# Altium schematic symbol library jlcpcb_2025_04_capacitors_extended_1206.schlib: 2503 symbols (part 5 of 14) (continued)
## C1206X475K025T
designator C?  Capacitance: 4.7uF  (hidden comment: *)
Capacitor, Ceramic (MLCC), 4.7uF, ±10%, 25V, X7R, ±10%, SMD 1206; Manufacturer: IHHEC(HOLY STONE ENTERPRISE CO., LTD); Manufacturer Part Number: C1206X475K025T; Package Size: 1206; JLCPCB Basic Part: No; JLCPCB Part Number: C915816; Supplier 1: LCSC; Category: Capacitors - MLCC; Supplier Part Number 1: C915816; Tolerance: ±10%; Voltage Rating: 25V; Temperature Coefficient: X7R; RoHS: Yes; ComponentLink1Description: Datasheet; ComponentLink1URL: https://wmsc.lcsc.com/wmsc/upload/file/pdf/v2/lcsc/2304140030_IHHEC-HOLY-STONE-ENTERPRISE-CO---LTD-C1206X475K025T_C915816.pdf; ComponentLink2Description: JLCPCB Part URL; ComponentLink2URL: https://jlcpcb.com/partdetail/C915816; ComponentLink3Description: LCSC Part URL; ComponentLink3URL: https://lcsc.com/product-detail/Multilayer-Ceramic-Capacitors-MLCC---SMD-SMT_IHHECHOLY-STONE-ENTERPRISE-CO.%2C-LTD-IHHECHOLY-STONE-ENTERPRISE-CO.%2C-LTD-C1206X475K025T_C915816.html
footprint CAP-1206 (1206 (3216M) Capacitor)
pins: 1, 2

## C1206X475K050T
designator C?  Capacitance: 4.7uF  (hidden comment: *)
Capacitor, Ceramic (MLCC), 4.7uF, ±10%, 50V, X7R, ±10%, SMD 1206; Manufacturer: IHHEC(HOLY STONE ENTERPRISE CO., LTD); Manufacturer Part Number: C1206X475K050T; Package Size: 1206; JLCPCB Basic Part: No; JLCPCB Part Number: C915818; Supplier 1: LCSC; Category: Capacitors - MLCC; Supplier Part Number 1: C915818; Tolerance: ±10%; Voltage Rating: 50V; Temperature Coefficient: X7R; RoHS: Yes; ComponentLink1Description: Datasheet; ComponentLink1URL: https://wmsc.lcsc.com/wmsc/upload/file/pdf/v2/lcsc/2304140030_IHHEC-HOLY-STONE-ENTERPRISE-CO---LTD-C1206X475K050T_C915818.pdf; ComponentLink2Description: JLCPCB Part URL; ComponentLink2URL: https://jlcpcb.com/partdetail/C915818; ComponentLink3Description: LCSC Part URL; ComponentLink3URL: https://lcsc.com/product-detail/Multilayer-Ceramic-Capacitors-MLCC---SMD-SMT_IHHECHOLY-STONE-ENTERPRISE-CO.%2C-LTD-IHHECHOLY-STONE-ENTERPRISE-CO.%2C-LTD-C1206X475K050T_C915818.html
footprint CAP-1206 (1206 (3216M) Capacitor)
pins: 1, 2

## C1206X475M050T
designator C?  Capacitance: 4.7uF  (hidden comment: *)
Capacitor, Ceramic (MLCC), 4.7uF, ±20%, 50V, X7R, ±20%, SMD 1206; Manufacturer: IHHEC(HOLY STONE ENTERPRISE CO., LTD); Manufacturer Part Number: C1206X475M050T; Package Size: 1206; JLCPCB Basic Part: No; JLCPCB Part Number: C961529; Supplier 1: LCSC; Category: Capacitors - MLCC; Supplier Part Number 1: C961529; Tolerance: ±20%; Voltage Rating: 50V; Temperature Coefficient: X7R; RoHS: Yes; ComponentLink1Description: Datasheet; ComponentLink1URL: https://wmsc.lcsc.com/wmsc/upload/file/pdf/v2/lcsc/2304140030_IHHEC-HOLY-STONE-ENTERPRISE-CO---LTD-C1206X475M050T_C961529.pdf; ComponentLink2Description: JLCPCB Part URL; ComponentLink2URL: https://jlcpcb.com/partdetail/C961529; ComponentLink3Description: LCSC Part URL; ComponentLink3URL: https://lcsc.com/product-detail/Multilayer-Ceramic-Capacitors-MLCC---SMD-SMT_IHHECHOLY-STONE-ENTERPRISE-CO.%2C-LTD-IHHECHOLY-STONE-ENTERPRISE-CO.%2C-LTD-C1206X475M050T_C961529.html
footprint CAP-1206 (1206 (3216M) Capacitor)
pins: 1, 2

## C1206X561K102T
designator C?  Capacitance: 560pF  (hidden comment: *)
Capacitor, Ceramic (MLCC), 560pF, ±10%, 1kV, X7R, ±10%, SMD 1206; Manufacturer: IHHEC(HOLY STONE ENTERPRISE CO., LTD); Manufacturer Part Number: C1206X561K102T; Package Size: 1206; JLCPCB Basic Part: No; JLCPCB Part Number: C106085; Supplier 1: LCSC; Category: Capacitors - MLCC; Supplier Part Number 1: C106085; Tolerance: ±10%; Voltage Rating: 1kV; Temperature Coefficient: X7R; RoHS: Yes; ComponentLink1Description: Datasheet; ComponentLink1URL: https://wmsc.lcsc.com/wmsc/upload/file/pdf/v2/lcsc/2304140030_IHHEC-HOLY-STONE-ENTERPRISE-CO---LTD-C1206X561K102T_C106085.pdf; ComponentLink2Description: JLCPCB Part URL; ComponentLink2URL: https://jlcpcb.com/partdetail/C106085; ComponentLink3Description: LCSC Part URL; ComponentLink3URL: https://lcsc.com/product-detail/Multilayer-Ceramic-Capacitors-MLCC---SMD-SMT_IHHECHOLY-STONE-ENTERPRISE-CO.%2C-LTD-IHHECHOLY-STONE-ENTERPRISE-CO.%2C-LTD-C1206X561K102T_C106085.html
footprint CAP-1206 (1206 (3216M) Capacitor)
pins: 1, 2

## C1206X561K202T
designator C?  Capacitance: 560pF  (hidden comment: *)
Capacitor, Ceramic (MLCC), 560pF, ±10%, 2kV, X7R, ±10%, SMD 1206; Manufacturer: IHHEC(HOLY STONE ENTERPRISE CO., LTD); Manufacturer Part Number: C1206X561K202T; Package Size: 1206; JLCPCB Basic Part: No; JLCPCB Part Number: C915829; Supplier 1: LCSC; Category: Capacitors - MLCC; Supplier Part Number 1: C915829; Tolerance: ±10%; Voltage Rating: 2kV; Temperature Coefficient: X7R; RoHS: Yes; ComponentLink1Description: Datasheet; ComponentLink1URL: https://wmsc.lcsc.com/wmsc/upload/file/pdf/v2/lcsc/2304140030_IHHEC-HOLY-STONE-ENTERPRISE-CO---LTD-C1206X561K202T_C915829.pdf; ComponentLink2Description: JLCPCB Part URL; ComponentLink2URL: https://jlcpcb.com/partdetail/C915829; ComponentLink3Description: LCSC Part URL; ComponentLink3URL: https://lcsc.com/product-detail/Multilayer-Ceramic-Capacitors-MLCC---SMD-SMT_IHHECHOLY-STONE-ENTERPRISE-CO.%2C-LTD-IHHECHOLY-STONE-ENTERPRISE-CO.%2C-LTD-C1206X561K202T_C915829.html
footprint CAP-1206 (1206 (3216M) Capacitor)
pins: 1, 2

## C1206X562K102T
designator C?  Capacitance: 5.6nF  (hidden comment: *)
Capacitor, Ceramic (MLCC), 5.6nF, ±10%, 1kV, X7R, ±10%, SMD 1206; Manufacturer: IHHEC(HOLY STONE ENTERPRISE CO., LTD); Manufacturer Part Number: C1206X562K102T; Package Size: 1206; JLCPCB Basic Part: No; JLCPCB Part Number: C480252; Supplier 1: LCSC; Category: Capacitors - MLCC; Supplier Part Number 1: C480252; Tolerance: ±10%; Voltage Rating: 1kV; Temperature Coefficient: X7R; RoHS: Yes; ComponentLink1Description: Datasheet; ComponentLink1URL: https://wmsc.lcsc.com/wmsc/upload/file/pdf/v2/lcsc/2304140030_IHHEC-HOLY-STONE-ENTERPRISE-CO---LTD-C1206X562K102T_C480252.pdf; ComponentLink2Description: JLCPCB Part URL; ComponentLink2URL: https://jlcpcb.com/partdetail/C480252; ComponentLink3Description: LCSC Part URL; ComponentLink3URL: https://lcsc.com/product-detail/Multilayer-Ceramic-Capacitors-MLCC---SMD-SMT_IHHECHOLY-STONE-ENTERPRISE-CO.%2C-LTD-IHHECHOLY-STONE-ENTERPRISE-CO.%2C-LTD-C1206X562K102T_C480252.html
footprint CAP-1206 (1206 (3216M) Capacitor)
pins: 1, 2

## C1206X563K501T
designator C?  Capacitance: 56nF  (hidden comment: *)
Capacitor, Ceramic (MLCC), 56nF, ±10%, 500V, X7R, ±10%, SMD 1206; Manufacturer: IHHEC(HOLY STONE ENTERPRISE CO., LTD); Manufacturer Part Number: C1206X563K501T; Package Size: 1206; JLCPCB Basic Part: No; JLCPCB Part Number: C106086; Supplier 1: LCSC; Category: Capacitors - MLCC; Supplier Part Number 1: C106086; Tolerance: ±10%; Voltage Rating: 500V; Temperature Coefficient: X7R; RoHS: Yes; ComponentLink1Description: Datasheet; ComponentLink1URL: https://wmsc.lcsc.com/wmsc/upload/file/pdf/v2/lcsc/2304140030_IHHEC-HOLY-STONE-ENTERPRISE-CO---LTD-C1206X563K501T_C106086.pdf; ComponentLink2Description: JLCPCB Part URL; ComponentLink2URL: https://jlcpcb.com/partdetail/C106086; ComponentLink3Description: LCSC Part URL; ComponentLink3URL: https://lcsc.com/product-detail/Multilayer-Ceramic-Capacitors-MLCC---SMD-SMT_IHHECHOLY-STONE-ENTERPRISE-CO.%2C-LTD-IHHECHOLY-STONE-ENTERPRISE-CO.%2C-LTD-C1206X563K501T_C106086.html
footprint CAP-1206 (1206 (3216M) Capacitor)
pins: 1, 2

## C1206X681K101T
designator C?  Capacitance: 680pF  (hidden comment: *)
Capacitor, Ceramic (MLCC), 680pF, ±10%, 100V, X7R, ±10%, SMD 1206; Manufacturer: IHHEC(HOLY STONE ENTERPRISE CO., LTD); Manufacturer Part Number: C1206X681K101T; Package Size: 1206; JLCPCB Basic Part: No; JLCPCB Part Number: C106087; Supplier 1: LCSC; Category: Capacitors - MLCC; Supplier Part Number 1: C106087; Tolerance: ±10%; Voltage Rating: 100V; Temperature Coefficient: X7R; RoHS: Yes; ComponentLink1Description: Datasheet; ComponentLink1URL: https://wmsc.lcsc.com/wmsc/upload/file/pdf/v2/lcsc/2304140030_IHHEC-HOLY-STONE-ENTERPRISE-CO---LTD-C1206X681K101T_C106087.pdf; ComponentLink2Description: JLCPCB Part URL; ComponentLink2URL: https://jlcpcb.com/partdetail/C106087; ComponentLink3Description: LCSC Part URL; ComponentLink3URL: https://lcsc.com/product-detail/Multilayer-Ceramic-Capacitors-MLCC---SMD-SMT_IHHECHOLY-STONE-ENTERPRISE-CO.%2C-LTD-IHHECHOLY-STONE-ENTERPRISE-CO.%2C-LTD-C1206X681K101T_C106087.html
footprint CAP-1206 (1206 (3216M) Capacitor)
pins: 1, 2

## C1206X681K251T
designator C?  Capacitance: 680pF  (hidden comment: *)
Capacitor, Ceramic (MLCC), 680pF, ±10%, 250V, X7R, ±10%, SMD 1206; Manufacturer: IHHEC(HOLY STONE ENTERPRISE CO., LTD); Manufacturer Part Number: C1206X681K251T; Package Size: 1206; JLCPCB Basic Part: No; JLCPCB Part Number: C106089; Supplier 1: LCSC; Category: Capacitors - MLCC; Supplier Part Number 1: C106089; Tolerance: ±10%; Voltage Rating: 250V; Temperature Coefficient: X7R; RoHS: Yes; ComponentLink1Description: Datasheet; ComponentLink1URL: https://wmsc.lcsc.com/wmsc/upload/file/pdf/v2/lcsc/2304140030_IHHEC-HOLY-STONE-ENTERPRISE-CO---LTD-C1206X681K251T_C106089.pdf; ComponentLink2Description: JLCPCB Part URL; ComponentLink2URL: https://jlcpcb.com/partdetail/C106089; ComponentLink3Description: LCSC Part URL; ComponentLink3URL: https://lcsc.com/product-detail/Multilayer-Ceramic-Capacitors-MLCC---SMD-SMT_IHHECHOLY-STONE-ENTERPRISE-CO.%2C-LTD-IHHECHOLY-STONE-ENTERPRISE-CO.%2C-LTD-C1206X681K251T_C106089.html
footprint CAP-1206 (1206 (3216M) Capacitor)
pins: 1, 2

## C1206X682K050T
designator C?  Capacitance: 6.8nF  (hidden comment: *)
Capacitor, Ceramic (MLCC), 6.8nF, ±10%, 50V, X7R, ±10%, SMD 1206; Manufacturer: IHHEC(HOLY STONE ENTERPRISE CO., LTD); Manufacturer Part Number: C1206X682K050T; Package Size: 1206; JLCPCB Basic Part: No; JLCPCB Part Number: C2915745; Supplier 1: LCSC; Category: Capacitors - MLCC; Supplier Part Number 1: C2915745; Tolerance: ±10%; Voltage Rating: 50V; Temperature Coefficient: X7R; RoHS: Yes; ComponentLink1Description: Datasheet; ComponentLink1URL: https://wmsc.lcsc.com/wmsc/upload/file/pdf/v2/lcsc/2111190930_IHHEC-HOLY-STONE-ENTERPRISE-CO---LTD-C1206X682K050T_C2915745.pdf; ComponentLink2Description: JLCPCB Part URL; ComponentLink2URL: https://jlcpcb.com/partdetail/C2915745; ComponentLink3Description: LCSC Part URL; ComponentLink3URL: https://lcsc.com/product-detail/Multilayer-Ceramic-Capacitors-MLCC---SMD-SMT_IHHECHOLY-STONE-ENTERPRISE-CO.%2C-LTD-IHHECHOLY-STONE-ENTERPRISE-CO.%2C-LTD-C1206X682K050T_C2915745.html
footprint CAP-1206 (1206 (3216M) Capacitor)
pins: 1, 2

## C1206X682K102T
designator C?  Capacitance: 6.8nF  (hidden comment: *)
Capacitor, Ceramic (MLCC), 6.8nF, ±10%, 1kV, X7R, ±10%, SMD 1206; Manufacturer: IHHEC(HOLY STONE ENTERPRISE CO., LTD); Manufacturer Part Number: C1206X682K102T; Package Size: 1206; JLCPCB Basic Part: No; JLCPCB Part Number: C106090; Supplier 1: LCSC; Category: Capacitors - MLCC; Supplier Part Number 1: C106090; Tolerance: ±10%; Voltage Rating: 1kV; Temperature Coefficient: X7R; RoHS: Yes; ComponentLink1Description: Datasheet; ComponentLink1URL: https://wmsc.lcsc.com/wmsc/upload/file/pdf/v2/lcsc/2304140030_IHHEC-HOLY-STONE-ENTERPRISE-CO---LTD-C1206X682K102T_C106090.pdf; ComponentLink2Description: JLCPCB Part URL; ComponentLink2URL: https://jlcpcb.com/partdetail/C106090; ComponentLink3Description: LCSC Part URL; ComponentLink3URL: https://lcsc.com/product-detail/Multilayer-Ceramic-Capacitors-MLCC---SMD-SMT_IHHECHOLY-STONE-ENTERPRISE-CO.%2C-LTD-IHHECHOLY-STONE-ENTERPRISE-CO.%2C-LTD-C1206X682K102T_C106090.html
footprint CAP-1206 (1206 (3216M) Capacitor)
pins: 1, 2

## C1206X682K251T
designator C?  Capacitance: 6.8nF  (hidden comment: *)
Capacitor, Ceramic (MLCC), 6.8nF, ±10%, 250V, X7R, ±10%, SMD 1206; Manufacturer: IHHEC(HOLY STONE ENTERPRISE CO., LTD); Manufacturer Part Number: C1206X682K251T; Package Size: 1206; JLCPCB Basic Part: No; JLCPCB Part Number: C398255; Supplier 1: LCSC; Category: Capacitors - MLCC; Supplier Part Number 1: C398255; Tolerance: ±10%; Voltage Rating: 250V; Temperature Coefficient: X7R; RoHS: Yes; ComponentLink1Description: Datasheet; ComponentLink1URL: https://wmsc.lcsc.com/wmsc/upload/file/pdf/v2/lcsc/2304140030_IHHEC-HOLY-STONE-ENTERPRISE-CO---LTD-C1206X682K251T_C398255.pdf; ComponentLink2Description: JLCPCB Part URL; ComponentLink2URL: https://jlcpcb.com/partdetail/C398255; ComponentLink3Description: LCSC Part URL; ComponentLink3URL: https://lcsc.com/product-detail/Multilayer-Ceramic-Capacitors-MLCC---SMD-SMT_IHHECHOLY-STONE-ENTERPRISE-CO.%2C-LTD-IHHECHOLY-STONE-ENTERPRISE-CO.%2C-LTD-C1206X682K251T_C398255.html
footprint CAP-1206 (1206 (3216M) Capacitor)
pins: 1, 2

## C1206X682K501T
designator C?  Capacitance: 6.8nF  (hidden comment: *)
Capacitor, Ceramic (MLCC), 6.8nF, ±10%, 500V, X7R, ±10%, SMD 1206; Manufacturer: IHHEC(HOLY STONE ENTERPRISE CO., LTD); Manufacturer Part Number: C1206X682K501T; Package Size: 1206; JLCPCB Basic Part: No; JLCPCB Part Number: C398256; Supplier 1: LCSC; Category: Capacitors - MLCC; Supplier Part Number 1: C398256; Tolerance: ±10%; Voltage Rating: 500V; Temperature Coefficient: X7R; RoHS: Yes; ComponentLink1Description: Datasheet; ComponentLink1URL: https://wmsc.lcsc.com/wmsc/upload/file/pdf/v2/lcsc/2304140030_IHHEC-HOLY-STONE-ENTERPRISE-CO---LTD-C1206X682K501T_C398256.pdf; ComponentLink2Description: JLCPCB Part URL; ComponentLink2URL: https://jlcpcb.com/partdetail/C398256; ComponentLink3Description: LCSC Part URL; ComponentLink3URL: https://lcsc.com/product-detail/Multilayer-Ceramic-Capacitors-MLCC---SMD-SMT_IHHECHOLY-STONE-ENTERPRISE-CO.%2C-LTD-IHHECHOLY-STONE-ENTERPRISE-CO.%2C-LTD-C1206X682K501T_C398256.html
footprint CAP-1206 (1206 (3216M) Capacitor)
pins: 1, 2

## C1206X683K501T
designator C?  Capacitance: 68nF  (hidden comment: *)
Capacitor, Ceramic (MLCC), 68nF, 500V, X7R, SMD 1206; Manufacturer: IHHEC(HOLY STONE ENTERPRISE CO., LTD); Manufacturer Part Number: C1206X683K501T; Package Size: 1206; JLCPCB Basic Part: No; JLCPCB Part Number: C2998563; Supplier 1: LCSC; Category: Capacitors - MLCC; Supplier Part Number 1: C2998563; Voltage Rating: 500V; Temperature Coefficient: X7R; RoHS: Yes; ComponentLink1Description: Datasheet; ComponentLink1URL: https://wmsc.lcsc.com/wmsc/upload/file/pdf/v2/lcsc/2205061616_IHHEC-HOLY-STONE-ENTERPRISE-CO---LTD-C1206X683K501T_C2998563.pdf; ComponentLink2Description: JLCPCB Part URL; ComponentLink2URL: https://jlcpcb.com/partdetail/C2998563; ComponentLink3Description: LCSC Part URL; ComponentLink3URL: https://lcsc.com/product-detail/Multilayer-Ceramic-Capacitors-MLCC---SMD-SMT_IHHECHOLY-STONE-ENTERPRISE-CO.%2C-LTD-IHHECHOLY-STONE-ENTERPRISE-CO.%2C-LTD-C1206X683K501T_C2998563.html
footprint CAP-1206 (1206 (3216M) Capacitor)
pins: 1, 2

## C1206X821K102T
designator C?  Capacitance: 820pF  (hidden comment: *)
Capacitor, Ceramic (MLCC), 820pF, ±10%, 1kV, X7R, ±10%, SMD 1206; Manufacturer: IHHEC(HOLY STONE ENTERPRISE CO., LTD); Manufacturer Part Number: C1206X821K102T; Package Size: 1206; JLCPCB Basic Part: No; JLCPCB Part Number: C106091; Supplier 1: LCSC; Category: Capacitors - MLCC; Supplier Part Number 1: C106091; Tolerance: ±10%; Voltage Rating: 1kV; Temperature Coefficient: X7R; RoHS: Yes; ComponentLink1Description: Datasheet; ComponentLink1URL: https://wmsc.lcsc.com/wmsc/upload/file/pdf/v2/lcsc/2304140030_IHHEC-HOLY-STONE-ENTERPRISE-CO---LTD-C1206X821K102T_C106091.pdf; ComponentLink2Description: JLCPCB Part URL; ComponentLink2URL: https://jlcpcb.com/partdetail/C106091; ComponentLink3Description: LCSC Part URL; ComponentLink3URL: https://lcsc.com/product-detail/Multilayer-Ceramic-Capacitors-MLCC---SMD-SMT_IHHECHOLY-STONE-ENTERPRISE-CO.%2C-LTD-IHHECHOLY-STONE-ENTERPRISE-CO.%2C-LTD-C1206X821K102T_C106091.html
footprint CAP-1206 (1206 (3216M) Capacitor)
pins: 1, 2

## C3216C0G1H103JT000N
designator C?  Capacitance: 10nF  (hidden comment: *)
Capacitor, Ceramic (MLCC), 10nF, ±5%, 50V, C0G, ±5%, SMD 1206; Manufacturer: TDK; Manufacturer Part Number: C3216C0G1H103JT000N; Package Size: 1206; JLCPCB Basic Part: No; JLCPCB Part Number: C694192; Supplier 1: LCSC; Category: Capacitors - MLCC; Supplier Part Number 1: C694192; Tolerance: ±5%; Voltage Rating: 50V; Temperature Coefficient: C0G; RoHS: Yes; ComponentLink1Description: Datasheet; ComponentLink1URL: https://wmsc.lcsc.com/wmsc/upload/file/pdf/v2/lcsc/2304140030_TDK-C3216C0G1H103JT000N_C694192.pdf; ComponentLink2Description: JLCPCB Part URL; ComponentLink2URL: https://jlcpcb.com/partdetail/C694192; ComponentLink3Description: LCSC Part URL; ComponentLink3URL: https://lcsc.com/product-detail/Multilayer-Ceramic-Capacitors-MLCC---SMD-SMT_TDK-TDK-C3216C0G1H103JT000N_C694192.html
footprint CAP-1206 (1206 (3216M) Capacitor)
pins: 1, 2

## C3216C0G1H104J160AE
designator C?  Capacitance: 100nF  (hidden comment: *)
Capacitor, Ceramic (MLCC), 100nF, ±5%, 50V, null, ±5%, SMD 1206; Manufacturer: TDK; Manufacturer Part Number: C3216C0G1H104J160AE; Package Size: 1206; JLCPCB Basic Part: No; JLCPCB Part Number: C2177077; Supplier 1: LCSC; Category: Capacitors - MLCC; Supplier Part Number 1: C2177077; Tolerance: ±5%; Voltage Rating: 50V; Temperature Coefficient: null; RoHS: Yes; ComponentLink1Description: Datasheet; ComponentLink1URL: https://wmsc.lcsc.com/wmsc/upload/file/pdf/v2/lcsc/2304140030_TDK-C3216C0G1H104J160AE_C2177077.pdf; ComponentLink2Description: JLCPCB Part URL; ComponentLink2URL: https://jlcpcb.com/partdetail/C2177077; ComponentLink3Description: LCSC Part URL; ComponentLink3URL: https://lcsc.com/product-detail/Multilayer-Ceramic-Capacitors-MLCC---SMD-SMT_TDK-TDK-C3216C0G1H104J160AE_C2177077.html
footprint CAP-1206 (1206 (3216M) Capacitor)
pins: 1, 2

## C3216C0G1H104JT000N
designator C?  Capacitance: 100nF  (hidden comment: *)
Capacitor, Ceramic (MLCC), 100nF, ±5%, 50V, C0G, ±5%, SMD 1206; Manufacturer: TDK; Manufacturer Part Number: C3216C0G1H104JT000N; Package Size: 1206; JLCPCB Basic Part: No; JLCPCB Part Number: C319186; Supplier 1: LCSC; Category: Capacitors - MLCC; Supplier Part Number 1: C319186; Tolerance: ±5%; Voltage Rating: 50V; Temperature Coefficient: C0G; RoHS: Yes; ComponentLink1Description: Datasheet; ComponentLink1URL: https://wmsc.lcsc.com/wmsc/upload/file/pdf/v2/lcsc/2304140030_TDK-C3216C0G1H104JT000N_C319186.pdf; ComponentLink2Description: JLCPCB Part URL; ComponentLink2URL: https://jlcpcb.com/partdetail/C319186; ComponentLink3Description: LCSC Part URL; ComponentLink3URL: https://lcsc.com/product-detail/Multilayer-Ceramic-Capacitors-MLCC---SMD-SMT_TDK-TDK-C3216C0G1H104JT000N_C319186.html
footprint CAP-1206 (1206 (3216M) Capacitor)
pins: 1, 2

## C3216C0G1H473JT000N
designator C?  Capacitance: 47nF  (hidden comment: *)
Capacitor, Ceramic (MLCC), 47nF, ±5%, 50V, C0G, ±5%, SMD 1206; Manufacturer: TDK; Manufacturer Part Number: C3216C0G1H473JT000N; Package Size: 1206; JLCPCB Basic Part: No; JLCPCB Part Number: C342651; Supplier 1: LCSC; Category: Capacitors - MLCC; Supplier Part Number 1: C342651; Tolerance: ±5%; Voltage Rating: 50V; Temperature Coefficient: C0G; RoHS: Yes; ComponentLink1Description: Datasheet; ComponentLink1URL: https://wmsc.lcsc.com/wmsc/upload/file/pdf/v2/lcsc/2304140030_TDK-C3216C0G1H473JT000N_C342651.pdf; ComponentLink2Description: JLCPCB Part URL; ComponentLink2URL: https://jlcpcb.com/partdetail/C342651; ComponentLink3Description: LCSC Part URL; ComponentLink3URL: https://lcsc.com/product-detail/Multilayer-Ceramic-Capacitors-MLCC---SMD-SMT_TDK-TDK-C3216C0G1H473JT000N_C342651.html
footprint CAP-1206 (1206 (3216M) Capacitor)
pins: 1, 2

## C3216C0G2A103JT000N
designator C?  Capacitance: 10nF  (hidden comment: *)
Capacitor, Ceramic (MLCC), 10nF, ±5%, 100V, C0G, ±5%, SMD 1206; Manufacturer: TDK; Manufacturer Part Number: C3216C0G2A103JT000N; Package Size: 1206; JLCPCB Basic Part: No; JLCPCB Part Number: C342748; Supplier 1: LCSC; Category: Capacitors - MLCC; Supplier Part Number 1: C342748; Tolerance: ±5%; Voltage Rating: 100V; Temperature Coefficient: C0G; RoHS: Yes; ComponentLink1Description: Datasheet; ComponentLink1URL: https://wmsc.lcsc.com/wmsc/upload/file/pdf/v2/lcsc/2304140030_TDK-C3216C0G2A103JT000N_C342748.pdf; ComponentLink2Description: JLCPCB Part URL; ComponentLink2URL: https://jlcpcb.com/partdetail/C342748; ComponentLink3Description: LCSC Part URL; ComponentLink3URL: https://lcsc.com/product-detail/Multilayer-Ceramic-Capacitors-MLCC---SMD-SMT_TDK-TDK-C3216C0G2A103JT000N_C342748.html
footprint CAP-1206 (1206 (3216M) Capacitor)
pins: 1, 2

## C3216C0G2A104JT000E
designator C?  Capacitance: 100nF  (hidden comment: *)
Capacitor, Ceramic (MLCC), 100nF, ±5%, 100V, C0G, ±5%, SMD 1206; Manufacturer: TDK; Manufacturer Part Number: C3216C0G2A104JT000E; Package Size: 1206; JLCPCB Basic Part: No; JLCPCB Part Number: C338111; Supplier 1: LCSC; Category: Capacitors - MLCC; Supplier Part Number 1: C338111; Tolerance: ±5%; Voltage Rating: 100V; Temperature Coefficient: C0G; RoHS: Yes; ComponentLink1Description: Datasheet; ComponentLink1URL: https://wmsc.lcsc.com/wmsc/upload/file/pdf/v2/lcsc/2304140030_TDK-C3216C0G2A104JT000E_C338111.pdf; ComponentLink2Description: JLCPCB Part URL; ComponentLink2URL: https://jlcpcb.com/partdetail/C338111; ComponentLink3Description: LCSC Part URL; ComponentLink3URL: https://lcsc.com/product-detail/Multilayer-Ceramic-Capacitors-MLCC---SMD-SMT_TDK-TDK-C3216C0G2A104JT000E_C338111.html
footprint CAP-1206 (1206 (3216M) Capacitor)
pins: 1, 2

## C3216C0G2A472JT000N
designator C?  Capacitance: 4.7nF  (hidden comment: *)
Capacitor, Ceramic (MLCC), 4.7nF, ±5%, 100V, C0G, ±5%, SMD 1206; Manufacturer: TDK; Manufacturer Part Number: C3216C0G2A472JT000N; Package Size: 1206; JLCPCB Basic Part: No; JLCPCB Part Number: C508859; Supplier 1: LCSC; Category: Capacitors - MLCC; Supplier Part Number 1: C508859; Tolerance: ±5%; Voltage Rating: 100V; Temperature Coefficient: C0G; RoHS: Yes; ComponentLink1Description: Datasheet; ComponentLink1URL: https://wmsc.lcsc.com/wmsc/upload/file/pdf/v2/lcsc/2304140030_TDK-C3216C0G2A472JT000N_C508859.pdf; ComponentLink2Description: JLCPCB Part URL; ComponentLink2URL: https://jlcpcb.com/partdetail/C508859; ComponentLink3Description: LCSC Part URL; ComponentLink3URL: https://lcsc.com/product-detail/Multilayer-Ceramic-Capacitors-MLCC---SMD-SMT_TDK-TDK-C3216C0G2A472JT000N_C508859.html
footprint CAP-1206 (1206 (3216M) Capacitor)
pins: 1, 2

## C3216C0G2A562JT000N
designator C?  Capacitance: 5.6nF  (hidden comment: *)
Capacitor, Ceramic (MLCC), 5.6nF, 100V, C0G, SMD 1206; Manufacturer: TDK; Manufacturer Part Number: C3216C0G2A562JT000N; Package Size: 1206; JLCPCB Basic Part: No; JLCPCB Part Number: C2939044; Supplier 1: LCSC; Category: Capacitors - MLCC; Supplier Part Number 1: C2939044; Voltage Rating: 100V; Temperature Coefficient: C0G; RoHS: Yes; ComponentLink1Description: Datasheet; ComponentLink1URL: https://wmsc.lcsc.com/wmsc/upload/file/pdf/v2/lcsc/2201121830_TDK-C3216C0G2A562JT000N_C2939044.pdf; ComponentLink2Description: JLCPCB Part URL; ComponentLink2URL: https://jlcpcb.com/partdetail/C2939044; ComponentLink3Description: LCSC Part URL; ComponentLink3URL: https://lcsc.com/product-detail/Multilayer-Ceramic-Capacitors-MLCC---SMD-SMT_TDK-TDK-C3216C0G2A562JT000N_C2939044.html
footprint CAP-1206 (1206 (3216M) Capacitor)
pins: 1, 2

## C3216C0G2A682JT000N
designator C?  Capacitance: 6.8nF  (hidden comment: *)
Capacitor, Ceramic (MLCC), 6.8nF, ±5%, 100V, C0G, ±5%, SMD 1206; Manufacturer: TDK; Manufacturer Part Number: C3216C0G2A682JT000N; Package Size: 1206; JLCPCB Basic Part: No; JLCPCB Part Number: C71300; Supplier 1: LCSC; Category: Capacitors - MLCC; Supplier Part Number 1: C71300; Tolerance: ±5%; Voltage Rating: 100V; Temperature Coefficient: C0G; RoHS: Yes; ComponentLink1Description: Datasheet; ComponentLink1URL: https://wmsc.lcsc.com/wmsc/upload/file/pdf/v2/lcsc/2304140030_TDK-C3216C0G2A682JT000N_C71300.pdf; ComponentLink2Description: JLCPCB Part URL; ComponentLink2URL: https://jlcpcb.com/partdetail/C71300; ComponentLink3Description: LCSC Part URL; ComponentLink3URL: https://lcsc.com/product-detail/Multilayer-Ceramic-Capacitors-MLCC---SMD-SMT_TDK-TDK-C3216C0G2A682JT000N_C71300.html
footprint CAP-1206 (1206 (3216M) Capacitor)
pins: 1, 2

## C3216C0G2A683JT000E
designator C?  Capacitance: 68nF  (hidden comment: *)
Capacitor, Ceramic (MLCC), 68nF, ±5%, 100V, C0G, ±5%, SMD 1206; Manufacturer: TDK; Manufacturer Part Number: C3216C0G2A683JT000E; Package Size: 1206; JLCPCB Basic Part: No; JLCPCB Part Number: C2991821; Supplier 1: LCSC; Category: Capacitors - MLCC; Supplier Part Number 1: C2991821; Tolerance: ±5%; Voltage Rating: 100V; Temperature Coefficient: C0G; RoHS: Yes; ComponentLink1Description: Datasheet; ComponentLink1URL: https://wmsc.lcsc.com/wmsc/upload/file/pdf/v2/lcsc/2204151015_TDK-C3216C0G2A683JT000E_C2991821.pdf; ComponentLink2Description: JLCPCB Part URL; ComponentLink2URL: https://jlcpcb.com/partdetail/C2991821; ComponentLink3Description: LCSC Part URL; ComponentLink3URL: https://lcsc.com/product-detail/Multilayer-Ceramic-Capacitors-MLCC---SMD-SMT_TDK-TDK-C3216C0G2A683JT000E_C2991821.html
footprint CAP-1206 (1206 (3216M) Capacitor)
pins: 1, 2

## C3216C0G2E103JT000N
designator C?  Capacitance: 10nF  (hidden comment: *)
Capacitor, Ceramic (MLCC), 10nF, ±5%, 250V, C0G, ±5%, SMD 1206; Manufacturer: TDK; Manufacturer Part Number: C3216C0G2E103JT000N; Package Size: 1206; JLCPCB Basic Part: No; JLCPCB Part Number: C531417; Supplier 1: LCSC; Category: Capacitors - MLCC; Supplier Part Number 1: C531417; Tolerance: ±5%; Voltage Rating: 250V; Temperature Coefficient: C0G; RoHS: Yes; ComponentLink1Description: Datasheet; ComponentLink2Description: JLCPCB Part URL; ComponentLink2URL: https://jlcpcb.com/partdetail/C531417; ComponentLink3Description: LCSC Part URL; ComponentLink3URL: https://lcsc.com/product-detail/Multilayer-Ceramic-Capacitors-MLCC---SMD-SMT_TDK-TDK-C3216C0G2E103JT000N_C531417.html
footprint CAP-1206 (1206 (3216M) Capacitor)
pins: 1, 2

## C3216C0G2E332JT000N
designator C?  Capacitance: 3.3nF  (hidden comment: *)
Capacitor, Ceramic (MLCC), 3.3nF, ±5%, 250V, C0G, ±5%, SMD 1206; Manufacturer: TDK; Manufacturer Part Number: C3216C0G2E332JT000N; Package Size: 1206; JLCPCB Basic Part: No; JLCPCB Part Number: C342766; Supplier 1: LCSC; Category: Capacitors - MLCC; Supplier Part Number 1: C342766; Tolerance: ±5%; Voltage Rating: 250V; Temperature Coefficient: C0G; RoHS: Yes; ComponentLink1Description: Datasheet; ComponentLink1URL: https://wmsc.lcsc.com/wmsc/upload/file/pdf/v2/lcsc/2304140030_TDK-C3216C0G2E332JT000N_C342766.pdf; ComponentLink2Description: JLCPCB Part URL; ComponentLink2URL: https://jlcpcb.com/partdetail/C342766; ComponentLink3Description: LCSC Part URL; ComponentLink3URL: https://lcsc.com/product-detail/Multilayer-Ceramic-Capacitors-MLCC---SMD-SMT_TDK-TDK-C3216C0G2E332JT000N_C342766.html
footprint CAP-1206 (1206 (3216M) Capacitor)
pins: 1, 2

## C3216C0G2E472JT000N
designator C?  Capacitance: 4.7nF  (hidden comment: *)
Capacitor, Ceramic (MLCC), 4.7nF, ±5%, 250V, C0G, ±5%, SMD 1206; Manufacturer: TDK; Manufacturer Part Number: C3216C0G2E472JT000N; Package Size: 1206; JLCPCB Basic Part: No; JLCPCB Part Number: C342765; Supplier 1: LCSC; Category: Capacitors - MLCC; Supplier Part Number 1: C342765; Tolerance: ±5%; Voltage Rating: 250V; Temperature Coefficient: C0G; RoHS: Yes; ComponentLink1Description: Datasheet; ComponentLink1URL: https://wmsc.lcsc.com/wmsc/upload/file/pdf/v2/lcsc/2304140030_TDK-C3216C0G2E472JT000N_C342765.pdf; ComponentLink2Description: JLCPCB Part URL; ComponentLink2URL: https://jlcpcb.com/partdetail/C342765; ComponentLink3Description: LCSC Part URL; ComponentLink3URL: https://lcsc.com/product-detail/Multilayer-Ceramic-Capacitors-MLCC---SMD-SMT_TDK-TDK-C3216C0G2E472JT000N_C342765.html
footprint CAP-1206 (1206 (3216M) Capacitor)
pins: 1, 2

## C3216C0G2E682JT000N
designator C?  Capacitance: 6.8nF  (hidden comment: *)
Capacitor, Ceramic (MLCC), 6.8nF, ±5%, 250V, C0G, ±5%, SMD 1206; Manufacturer: TDK; Manufacturer Part Number: C3216C0G2E682JT000N; Package Size: 1206; JLCPCB Basic Part: No; JLCPCB Part Number: C694463; Supplier 1: LCSC; Category: Capacitors - MLCC; Supplier Part Number 1: C694463; Tolerance: ±5%; Voltage Rating: 250V; Temperature Coefficient: C0G; RoHS: Yes; ComponentLink1Description: Datasheet; ComponentLink1URL: https://wmsc.lcsc.com/wmsc/upload/file/pdf/v2/lcsc/2304140030_TDK-C3216C0G2E682JT000N_C694463.pdf; ComponentLink2Description: JLCPCB Part URL; ComponentLink2URL: https://jlcpcb.com/partdetail/C694463; ComponentLink3Description: LCSC Part URL; ComponentLink3URL: https://lcsc.com/product-detail/Multilayer-Ceramic-Capacitors-MLCC---SMD-SMT_TDK-TDK-C3216C0G2E682JT000N_C694463.html
footprint CAP-1206 (1206 (3216M) Capacitor)
pins: 1, 2

## C3216C0G2J101JT000N
designator C?  Capacitance: 100pF  (hidden comment: *)
Capacitor, Ceramic (MLCC), 100pF, ±5%, 630V, C0G, ±5%, SMD 1206; Manufacturer: TDK; Manufacturer Part Number: C3216C0G2J101JT000N; Package Size: 1206; JLCPCB Basic Part: No; JLCPCB Part Number: C342968; Supplier 1: LCSC; Category: Capacitors - MLCC; Supplier Part Number 1: C342968; Tolerance: ±5%; Voltage Rating: 630V; Temperature Coefficient: C0G; RoHS: Yes; ComponentLink1Description: Datasheet; ComponentLink1URL: https://wmsc.lcsc.com/wmsc/upload/file/pdf/v2/lcsc/2304140030_TDK-C3216C0G2J101JT000N_C342968.pdf; ComponentLink2Description: JLCPCB Part URL; ComponentLink2URL: https://jlcpcb.com/partdetail/C342968; ComponentLink3Description: LCSC Part URL; ComponentLink3URL: https://lcsc.com/product-detail/Multilayer-Ceramic-Capacitors-MLCC---SMD-SMT_TDK-TDK-C3216C0G2J101JT000N_C342968.html
footprint CAP-1206 (1206 (3216M) Capacitor)
pins: 1, 2

## C3216C0G2J102JT000N
designator C?  Capacitance: 1nF  (hidden comment: *)
Capacitor, Ceramic (MLCC), 1nF, ±5%, 630V, C0G, ±5%, SMD 1206; Manufacturer: TDK; Manufacturer Part Number: C3216C0G2J102JT000N; Package Size: 1206; JLCPCB Basic Part: No; JLCPCB Part Number: C342954; Supplier 1: LCSC; Category: Capacitors - MLCC; Supplier Part Number 1: C342954; Tolerance: ±5%; Voltage Rating: 630V; Temperature Coefficient: C0G; RoHS: Yes; ComponentLink1Description: Datasheet; ComponentLink1URL: https://wmsc.lcsc.com/wmsc/upload/file/pdf/v2/lcsc/2304140030_TDK-C3216C0G2J102JT000N_C342954.pdf; ComponentLink2Description: JLCPCB Part URL; ComponentLink2URL: https://jlcpcb.com/partdetail/C342954; ComponentLink3Description: LCSC Part URL; ComponentLink3URL: https://lcsc.com/product-detail/Multilayer-Ceramic-Capacitors-MLCC---SMD-SMT_TDK-TDK-C3216C0G2J102JT000N_C342954.html
footprint CAP-1206 (1206 (3216M) Capacitor)
pins: 1, 2

## C3216C0G2J103JT000N
designator C?  Capacitance: 10nF  (hidden comment: *)
Capacitor, Ceramic (MLCC), 10nF, ±5%, 630V, C0G, ±5%, SMD 1206; Manufacturer: TDK; Manufacturer Part Number: C3216C0G2J103JT000N; Package Size: 1206; JLCPCB Basic Part: No; JLCPCB Part Number: C342714; Supplier 1: LCSC; Category: Capacitors - MLCC; Supplier Part Number 1: C342714; Tolerance: ±5%; Voltage Rating: 630V; Temperature Coefficient: C0G; RoHS: Yes; ComponentLink1Description: Datasheet; ComponentLink1URL: https://wmsc.lcsc.com/wmsc/upload/file/pdf/v2/lcsc/2304140030_TDK-C3216C0G2J103JT000N_C342714.pdf; ComponentLink2Description: JLCPCB Part URL; ComponentLink2URL: https://jlcpcb.com/partdetail/C342714; ComponentLink3Description: LCSC Part URL; ComponentLink3URL: https://lcsc.com/product-detail/Multilayer-Ceramic-Capacitors-MLCC---SMD-SMT_TDK-TDK-C3216C0G2J103JT000N_C342714.html
footprint CAP-1206 (1206 (3216M) Capacitor)
pins: 1, 2

## C3216C0G2J152JT000N
designator C?  Capacitance: 1.5nF  (hidden comment: *)
Capacitor, Ceramic (MLCC), 1.5nF, ±5%, 630V, C0G, ±5%, SMD 1206; Manufacturer: TDK; Manufacturer Part Number: C3216C0G2J152JT000N; Package Size: 1206; JLCPCB Basic Part: No; JLCPCB Part Number: C342838; Supplier 1: LCSC; Category: Capacitors - MLCC; Supplier Part Number 1: C342838; Tolerance: ±5%; Voltage Rating: 630V; Temperature Coefficient: C0G; RoHS: Yes; ComponentLink1Description: Datasheet; ComponentLink1URL: https://wmsc.lcsc.com/wmsc/upload/file/pdf/v2/lcsc/2304140030_TDK-C3216C0G2J152JT000N_C342838.pdf; ComponentLink2Description: JLCPCB Part URL; ComponentLink2URL: https://jlcpcb.com/partdetail/C342838; ComponentLink3Description: LCSC Part URL; ComponentLink3URL: https://lcsc.com/product-detail/Multilayer-Ceramic-Capacitors-MLCC---SMD-SMT_TDK-TDK-C3216C0G2J152JT000N_C342838.html
footprint CAP-1206 (1206 (3216M) Capacitor)
pins: 1, 2

## C3216C0G2J221JT000N
designator C?  Capacitance: 220pF  (hidden comment: *)
Capacitor, Ceramic (MLCC), 220pF, ±5%, 630V, C0G, ±5%, SMD 1206; Manufacturer: TDK; Manufacturer Part Number: C3216C0G2J221JT000N; Package Size: 1206; JLCPCB Basic Part: No; JLCPCB Part Number: C76654; Supplier 1: LCSC; Category: Capacitors - MLCC; Supplier Part Number 1: C76654; Tolerance: ±5%; Voltage Rating: 630V; Temperature Coefficient: C0G; RoHS: Yes; ComponentLink1Description: Datasheet; ComponentLink1URL: https://wmsc.lcsc.com/wmsc/upload/file/pdf/v2/lcsc/2304140030_TDK-C3216C0G2J221JT000N_C76654.pdf; ComponentLink2Description: JLCPCB Part URL; ComponentLink2URL: https://jlcpcb.com/partdetail/C76654; ComponentLink3Description: LCSC Part URL; ComponentLink3URL: https://lcsc.com/product-detail/Multilayer-Ceramic-Capacitors-MLCC---SMD-SMT_TDK-TDK-C3216C0G2J221JT000N_C76654.html
footprint CAP-1206 (1206 (3216M) Capacitor)
pins: 1, 2

## C3216C0G2J222JT000N
designator C?  Capacitance: 2.2nF  (hidden comment: *)
Capacitor, Ceramic (MLCC), 2.2nF, ±5%, 630V, C0G, ±5%, SMD 1206; Manufacturer: TDK; Manufacturer Part Number: C3216C0G2J222JT000N; Package Size: 1206; JLCPCB Basic Part: No; JLCPCB Part Number: C342846; Supplier 1: LCSC; Category: Capacitors - MLCC; Supplier Part Number 1: C342846; Tolerance: ±5%; Voltage Rating: 630V; Temperature Coefficient: C0G; RoHS: Yes; ComponentLink1Description: Datasheet; ComponentLink1URL: https://wmsc.lcsc.com/wmsc/upload/file/pdf/v2/lcsc/2304140030_TDK-C3216C0G2J222JT000N_C342846.pdf; ComponentLink2Description: JLCPCB Part URL; ComponentLink2URL: https://jlcpcb.com/partdetail/C342846; ComponentLink3Description: LCSC Part URL; ComponentLink3URL: https://lcsc.com/product-detail/Multilayer-Ceramic-Capacitors-MLCC---SMD-SMT_TDK-TDK-C3216C0G2J222JT000N_C342846.html
footprint CAP-1206 (1206 (3216M) Capacitor)
pins: 1, 2

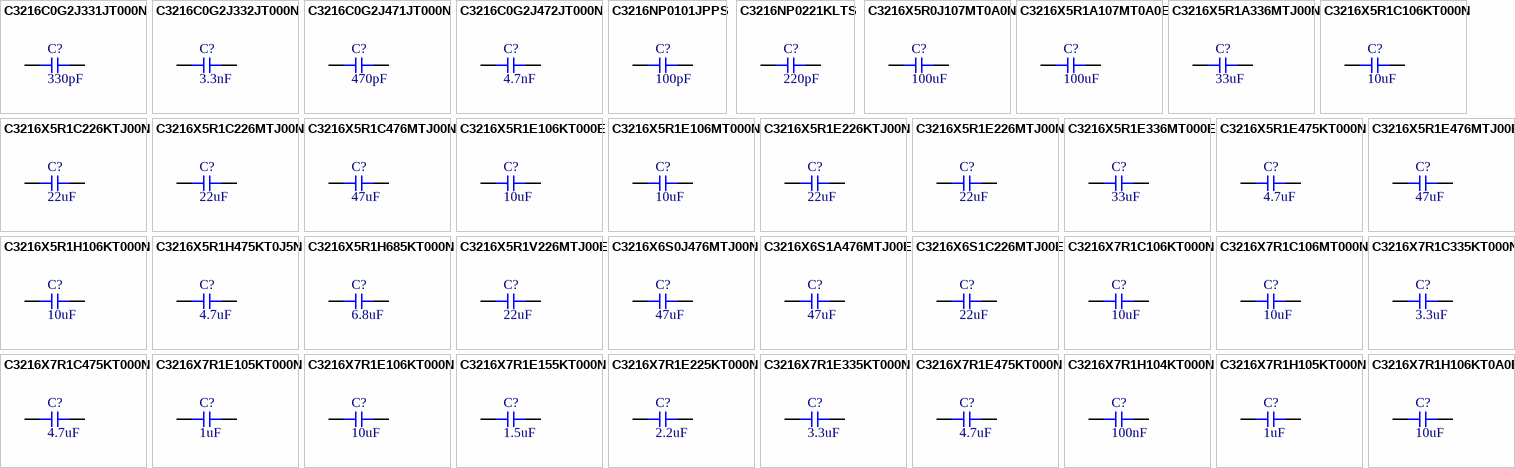
[diagram p21: symbols C3216C0G2J331JT000N to C3216X7R1H106KT0A0E]

## C3216C0G2J331JT000N
designator C?  Capacitance: 330pF  (hidden comment: *)
Capacitor, Ceramic (MLCC), 330pF, ±5%, 630V, C0G, ±5%, SMD 1206; Manufacturer: TDK; Manufacturer Part Number: C3216C0G2J331JT000N; Package Size: 1206; JLCPCB Basic Part: No; JLCPCB Part Number: C337998; Supplier 1: LCSC; Category: Capacitors - MLCC; Supplier Part Number 1: C337998; Tolerance: ±5%; Voltage Rating: 630V; Temperature Coefficient: C0G; RoHS: Yes; ComponentLink1Description: Datasheet; ComponentLink1URL: https://wmsc.lcsc.com/wmsc/upload/file/pdf/v2/lcsc/2304140030_TDK-C3216C0G2J331JT000N_C337998.pdf; ComponentLink2Description: JLCPCB Part URL; ComponentLink2URL: https://jlcpcb.com/partdetail/C337998; ComponentLink3Description: LCSC Part URL; ComponentLink3URL: https://lcsc.com/product-detail/Multilayer-Ceramic-Capacitors-MLCC---SMD-SMT_TDK-TDK-C3216C0G2J331JT000N_C337998.html
footprint CAP-1206 (1206 (3216M) Capacitor)
pins: 1, 2

## C3216C0G2J332JT000N
designator C?  Capacitance: 3.3nF  (hidden comment: *)
Capacitor, Ceramic (MLCC), 3.3nF, ±5%, 630V, C0G, ±5%, SMD 1206; Manufacturer: TDK; Manufacturer Part Number: C3216C0G2J332JT000N; Package Size: 1206; JLCPCB Basic Part: No; JLCPCB Part Number: C342755; Supplier 1: LCSC; Category: Capacitors - MLCC; Supplier Part Number 1: C342755; Tolerance: ±5%; Voltage Rating: 630V; Temperature Coefficient: C0G; RoHS: Yes; ComponentLink1Description: Datasheet; ComponentLink1URL: https://wmsc.lcsc.com/wmsc/upload/file/pdf/v2/lcsc/2304140030_TDK-C3216C0G2J332JT000N_C342755.pdf; ComponentLink2Description: JLCPCB Part URL; ComponentLink2URL: https://jlcpcb.com/partdetail/C342755; ComponentLink3Description: LCSC Part URL; ComponentLink3URL: https://lcsc.com/product-detail/Multilayer-Ceramic-Capacitors-MLCC---SMD-SMT_TDK-TDK-C3216C0G2J332JT000N_C342755.html
footprint CAP-1206 (1206 (3216M) Capacitor)
pins: 1, 2

## C3216C0G2J471JT000N
designator C?  Capacitance: 470pF  (hidden comment: *)
Capacitor, Ceramic (MLCC), 470pF, ±5%, 630V, C0G, ±5%, SMD 1206; Manufacturer: TDK; Manufacturer Part Number: C3216C0G2J471JT000N; Package Size: 1206; JLCPCB Basic Part: No; JLCPCB Part Number: C337999; Supplier 1: LCSC; Category: Capacitors - MLCC; Supplier Part Number 1: C337999; Tolerance: ±5%; Voltage Rating: 630V; Temperature Coefficient: C0G; RoHS: Yes; ComponentLink1Description: Datasheet; ComponentLink1URL: https://wmsc.lcsc.com/wmsc/upload/file/pdf/v2/lcsc/2304140030_TDK-C3216C0G2J471JT000N_C337999.pdf; ComponentLink2Description: JLCPCB Part URL; ComponentLink2URL: https://jlcpcb.com/partdetail/C337999; ComponentLink3Description: LCSC Part URL; ComponentLink3URL: https://lcsc.com/product-detail/Multilayer-Ceramic-Capacitors-MLCC---SMD-SMT_TDK-TDK-C3216C0G2J471JT000N_C337999.html
footprint CAP-1206 (1206 (3216M) Capacitor)
pins: 1, 2

## C3216C0G2J472JT000N
designator C?  Capacitance: 4.7nF  (hidden comment: *)
Capacitor, Ceramic (MLCC), 4.7nF, ±5%, 630V, C0G, ±5%, SMD 1206; Manufacturer: TDK; Manufacturer Part Number: C3216C0G2J472JT000N; Package Size: 1206; JLCPCB Basic Part: No; JLCPCB Part Number: C342746; Supplier 1: LCSC; Category: Capacitors - MLCC; Supplier Part Number 1: C342746; Tolerance: ±5%; Voltage Rating: 630V; Temperature Coefficient: C0G; RoHS: Yes; ComponentLink1Description: Datasheet; ComponentLink1URL: https://wmsc.lcsc.com/wmsc/upload/file/pdf/v2/lcsc/2304140030_TDK-C3216C0G2J472JT000N_C342746.pdf; ComponentLink2Description: JLCPCB Part URL; ComponentLink2URL: https://jlcpcb.com/partdetail/C342746; ComponentLink3Description: LCSC Part URL; ComponentLink3URL: https://lcsc.com/product-detail/Multilayer-Ceramic-Capacitors-MLCC---SMD-SMT_TDK-TDK-C3216C0G2J472JT000N_C342746.html
footprint CAP-1206 (1206 (3216M) Capacitor)
pins: 1, 2

## C3216NP0101JPPS
designator C?  Capacitance: 100pF  (hidden comment: *)
Capacitor, Ceramic (MLCC), 100pF, ±5%, 1kV, NP0, ±5%, SMD 1206; Manufacturer: Darfon Elec; Manufacturer Part Number: C3216NP0101JPPS; Package Size: 1206; JLCPCB Basic Part: No; JLCPCB Part Number: C725586; Supplier 1: LCSC; Category: Capacitors - MLCC; Supplier Part Number 1: C725586; Tolerance: ±5%; Voltage Rating: 1kV; Temperature Coefficient: NP0; RoHS: Yes; ComponentLink1Description: Datasheet; ComponentLink1URL: https://wmsc.lcsc.com/wmsc/upload/file/pdf/v2/lcsc/2304140030_Darfon-Elec-C3216NP0101JPPS_C725586.pdf; ComponentLink2Description: JLCPCB Part URL; ComponentLink2URL: https://jlcpcb.com/partdetail/C725586; ComponentLink3Description: LCSC Part URL; ComponentLink3URL: https://lcsc.com/product-detail/Multilayer-Ceramic-Capacitors-MLCC---SMD-SMT_Darfon-Elec-Darfon-Elec-C3216NP0101JPPS_C725586.html
footprint CAP-1206 (1206 (3216M) Capacitor)
pins: 1, 2

## C3216NP0221KLTS
designator C?  Capacitance: 220pF  (hidden comment: *)
Capacitor, Ceramic (MLCC), 220pF, ±10%, 500V, NP0, ±10%, SMD 1206; Manufacturer: Darfon Elec; Manufacturer Part Number: C3216NP0221KLTS; Package Size: 1206; JLCPCB Basic Part: No; JLCPCB Part Number: C725578; Supplier 1: LCSC; Category: Capacitors - MLCC; Supplier Part Number 1: C725578; Tolerance: ±10%; Voltage Rating: 500V; Temperature Coefficient: NP0; RoHS: Yes; ComponentLink1Description: Datasheet; ComponentLink1URL: https://wmsc.lcsc.com/wmsc/upload/file/pdf/v2/lcsc/2304140030_Darfon-Elec-C3216NP0221KLTS_C725578.pdf; ComponentLink2Description: JLCPCB Part URL; ComponentLink2URL: https://jlcpcb.com/partdetail/C725578; ComponentLink3Description: LCSC Part URL; ComponentLink3URL: https://lcsc.com/product-detail/Multilayer-Ceramic-Capacitors-MLCC---SMD-SMT_Darfon-Elec-Darfon-Elec-C3216NP0221KLTS_C725578.html
footprint CAP-1206 (1206 (3216M) Capacitor)
pins: 1, 2

## C3216X5R0J107MT0A0N
designator C?  Capacitance: 100uF  (hidden comment: *)
Capacitor, Ceramic (MLCC), 100uF, ±20%, 6.3V, X5R, ±20%, SMD 1206; Manufacturer: TDK; Manufacturer Part Number: C3216X5R0J107MT0A0N; Package Size: 1206; JLCPCB Basic Part: No; JLCPCB Part Number: C342305; Supplier 1: LCSC; Category: Capacitors - MLCC; Supplier Part Number 1: C342305; Tolerance: ±20%; Voltage Rating: 6.3V; Temperature Coefficient: X5R; RoHS: Yes; ComponentLink1Description: Datasheet; ComponentLink1URL: https://wmsc.lcsc.com/wmsc/upload/file/pdf/v2/lcsc/2304140030_TDK-C3216X5R0J107MT0A0N_C342305.pdf; ComponentLink2Description: JLCPCB Part URL; ComponentLink2URL: https://jlcpcb.com/partdetail/C342305; ComponentLink3Description: LCSC Part URL; ComponentLink3URL: https://lcsc.com/product-detail/Multilayer-Ceramic-Capacitors-MLCC---SMD-SMT_TDK-TDK-C3216X5R0J107MT0A0N_C342305.html
footprint CAP-1206 (1206 (3216M) Capacitor)
pins: 1, 2

## C3216X5R1A107MT0A0E
designator C?  Capacitance: 100uF  (hidden comment: *)
Capacitor, Ceramic (MLCC), 100uF, ±20%, 10V, X5R, ±20%, SMD 1206; Manufacturer: TDK; Manufacturer Part Number: C3216X5R1A107MT0A0E; Package Size: 1206; JLCPCB Basic Part: No; JLCPCB Part Number: C76656; Supplier 1: LCSC; Category: Capacitors - MLCC; Supplier Part Number 1: C76656; Tolerance: ±20%; Voltage Rating: 10V; Temperature Coefficient: X5R; RoHS: Yes; ComponentLink1Description: Datasheet; ComponentLink1URL: https://wmsc.lcsc.com/wmsc/upload/file/pdf/v2/lcsc/2304140030_TDK-C3216X5R1A107MT0A0E_C76656.pdf; ComponentLink2Description: JLCPCB Part URL; ComponentLink2URL: https://jlcpcb.com/partdetail/C76656; ComponentLink3Description: LCSC Part URL; ComponentLink3URL: https://lcsc.com/product-detail/Multilayer-Ceramic-Capacitors-MLCC---SMD-SMT_TDK-TDK-C3216X5R1A107MT0A0E_C76656.html
footprint CAP-1206 (1206 (3216M) Capacitor)
pins: 1, 2

## C3216X5R1A336MTJ00N
designator C?  Capacitance: 33uF  (hidden comment: *)
Capacitor, Ceramic (MLCC), 33uF, ±20%, 10V, X5R, ±20%, SMD 1206; Manufacturer: TDK; Manufacturer Part Number: C3216X5R1A336MTJ00N; Package Size: 1206; JLCPCB Basic Part: No; JLCPCB Part Number: C342606; Supplier 1: LCSC; Category: Capacitors - MLCC; Supplier Part Number 1: C342606; Tolerance: ±20%; Voltage Rating: 10V; Temperature Coefficient: X5R; RoHS: Yes; ComponentLink1Description: Datasheet; ComponentLink1URL: https://wmsc.lcsc.com/wmsc/upload/file/pdf/v2/lcsc/2304140030_TDK-C3216X5R1A336MTJ00N_C342606.pdf; ComponentLink2Description: JLCPCB Part URL; ComponentLink2URL: https://jlcpcb.com/partdetail/C342606; ComponentLink3Description: LCSC Part URL; ComponentLink3URL: https://lcsc.com/product-detail/Multilayer-Ceramic-Capacitors-MLCC---SMD-SMT_TDK-TDK-C3216X5R1A336MTJ00N_C342606.html
footprint CAP-1206 (1206 (3216M) Capacitor)
pins: 1, 2

## C3216X5R1C106KT000N
designator C?  Capacitance: 10uF  (hidden comment: *)
Capacitor, Ceramic (MLCC), 10uF, ±10%, 16V, X5R, ±10%, SMD 1206; Manufacturer: TDK; Manufacturer Part Number: C3216X5R1C106KT000N; Package Size: 1206; JLCPCB Basic Part: No; JLCPCB Part Number: C136195; Supplier 1: LCSC; Category: Capacitors - MLCC; Supplier Part Number 1: C136195; Tolerance: ±10%; Voltage Rating: 16V; Temperature Coefficient: X5R; RoHS: Yes; ComponentLink1Description: Datasheet; ComponentLink1URL: https://wmsc.lcsc.com/wmsc/upload/file/pdf/v2/lcsc/2304140030_TDK-C3216X5R1C106KT000N_C136195.pdf; ComponentLink2Description: JLCPCB Part URL; ComponentLink2URL: https://jlcpcb.com/partdetail/C136195; ComponentLink3Description: LCSC Part URL; ComponentLink3URL: https://lcsc.com/product-detail/Multilayer-Ceramic-Capacitors-MLCC---SMD-SMT_TDK-TDK-C3216X5R1C106KT000N_C136195.html
footprint CAP-1206 (1206 (3216M) Capacitor)
pins: 1, 2

## C3216X5R1C226KTJ00N
designator C?  Capacitance: 22uF  (hidden comment: *)
Capacitor, Ceramic (MLCC), 22uF, ±10%, 16V, X5R, ±10%, SMD 1206; Manufacturer: TDK; Manufacturer Part Number: C3216X5R1C226KTJ00N; Package Size: 1206; JLCPCB Basic Part: No; JLCPCB Part Number: C338062; Supplier 1: LCSC; Category: Capacitors - MLCC; Supplier Part Number 1: C338062; Tolerance: ±10%; Voltage Rating: 16V; Temperature Coefficient: X5R; RoHS: Yes; ComponentLink1Description: Datasheet; ComponentLink1URL: https://wmsc.lcsc.com/wmsc/upload/file/pdf/v2/lcsc/2304140030_TDK-C3216X5R1C226KTJ00N_C338062.pdf; ComponentLink2Description: JLCPCB Part URL; ComponentLink2URL: https://jlcpcb.com/partdetail/C338062; ComponentLink3Description: LCSC Part URL; ComponentLink3URL: https://lcsc.com/product-detail/Multilayer-Ceramic-Capacitors-MLCC---SMD-SMT_TDK-TDK-C3216X5R1C226KTJ00N_C338062.html
footprint CAP-1206 (1206 (3216M) Capacitor)
pins: 1, 2

## C3216X5R1C226MTJ00N
designator C?  Capacitance: 22uF  (hidden comment: *)
Capacitor, Ceramic (MLCC), 22uF, ±20%, 16V, X5R, ±20%, SMD 1206; Manufacturer: TDK; Manufacturer Part Number: C3216X5R1C226MTJ00N; Package Size: 1206; JLCPCB Basic Part: No; JLCPCB Part Number: C342621; Supplier 1: LCSC; Category: Capacitors - MLCC; Supplier Part Number 1: C342621; Tolerance: ±20%; Voltage Rating: 16V; Temperature Coefficient: X5R; RoHS: Yes; ComponentLink1Description: Datasheet; ComponentLink1URL: https://wmsc.lcsc.com/wmsc/upload/file/pdf/v2/lcsc/2304140030_TDK-C3216X5R1C226MTJ00N_C342621.pdf; ComponentLink2Description: JLCPCB Part URL; ComponentLink2URL: https://jlcpcb.com/partdetail/C342621; ComponentLink3Description: LCSC Part URL; ComponentLink3URL: https://lcsc.com/product-detail/Multilayer-Ceramic-Capacitors-MLCC---SMD-SMT_TDK-TDK-C3216X5R1C226MTJ00N_C342621.html
footprint CAP-1206 (1206 (3216M) Capacitor)
pins: 1, 2
